# Altium footprint library PcbLib.PcbLib: 68 footprints (part 3 of 5)
Each footprint in its own frame and in the unit in brackets; x right, y up, seen from the top. Pads: shape width x height; smd on the part's side, far side on the other; paste and mask are expansions set on the pad; w line width, h text height; cw(c..) or ccw(c..) is an arc to the next point about the centre after c.
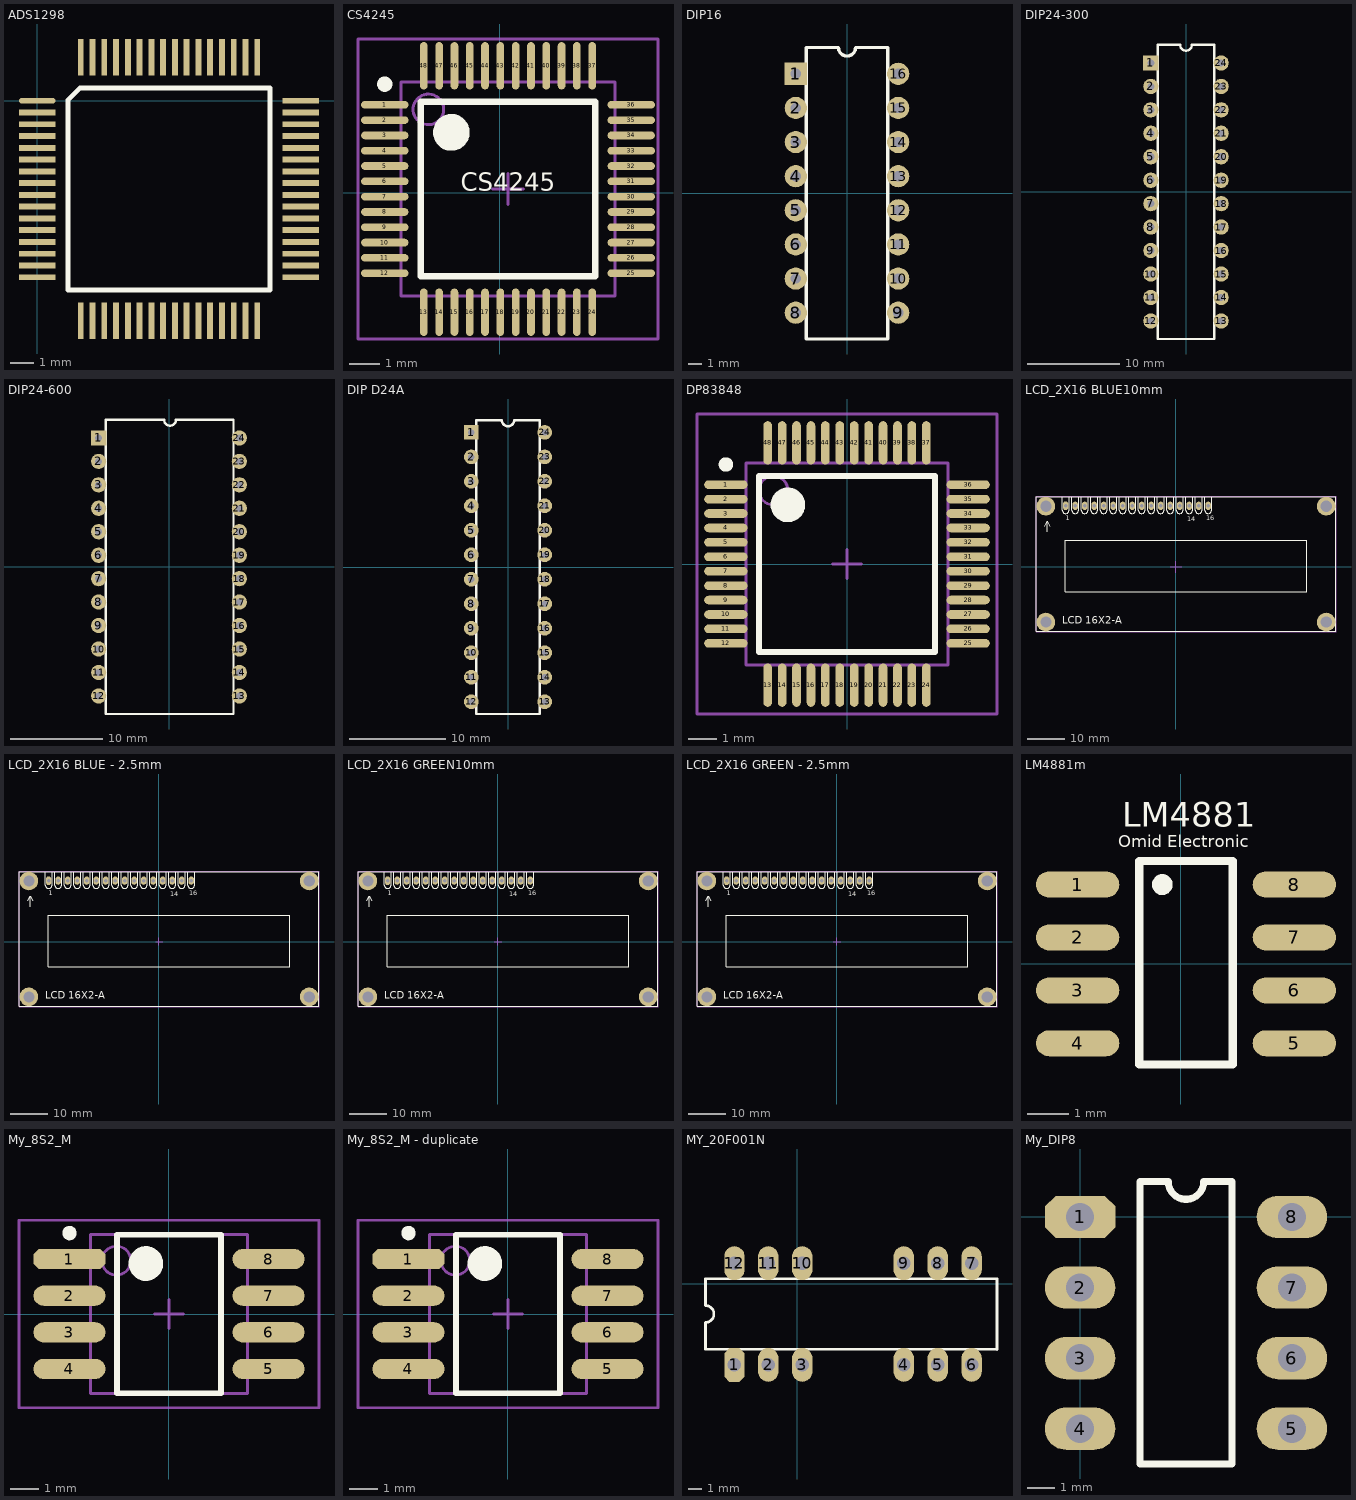
[diagram p2: the footprints below, top view; thin cyan lines are the x and y axes]

## ADS1298 [mm]
pads (64):
  oval 1.55x0.25 smd: 1(0,0)
  rect 1.55x0.25 smd: 2(0,-0.5) 3(0,-1) 4(0,-1.5) 5(0,-2) 6(0,-2.5) 7(0,-3) 8(0,-3.5) 9(0,-4) 10(0,-4.5) 11(0,-5) 12(0,-5.5) 13(0,-6) 14(0,-6.5) 15(0,-7) 16(0,-7.5) 33(11.2,-7.5) 34(11.2,-7) 35(11.2,-6.5) 36(11.2,-6) 37(11.2,-5.5) 38(11.2,-5) 39(11.2,-4.5) 40(11.2,-4) 41(11.2,-3.5) 42(11.2,-3) 43(11.2,-2.5) 44(11.2,-2) 45(11.2,-1.5) 46(11.2,-1) 47(11.2,-0.5) 48(11.2,0)
  rect 0.25x1.55 smd: 17(1.85,-9.35) 18(2.35,-9.35) 19(2.85,-9.35) 20(3.35,-9.35) 21(3.85,-9.35) 22(4.35,-9.35) 23(4.85,-9.35) 24(5.35,-9.35) 25(5.85,-9.35) 26(6.35,-9.35) 27(6.85,-9.35) 28(7.35,-9.35) 29(7.85,-9.35) 30(8.35,-9.35) 31(8.85,-9.35) 32(9.35,-9.35) 49(9.35,1.85) 50(8.85,1.85) 51(8.35,1.85) 52(7.85,1.85) 53(7.35,1.85) 54(6.85,1.85) 55(6.35,1.85) 56(5.85,1.85) 57(5.35,1.85) 58(4.85,1.85) 59(4.35,1.85) 60(3.85,1.85) 61(3.35,1.85) 62(2.85,1.85) 63(2.35,1.85) 64(1.85,1.85)
Top Overlay:
  lines w0.2: 1.31,-8.04 1.31,0.04 1.81,0.54 9.89,0.54 9.89,-8.04 1.31,-8.04

## CS4245 [mm]
pads (48):
  oval 1.55x0.25 smd: 1(-3.75,2.875) 2(-3.75,2.375) 3(-3.75,1.875) 4(-3.75,1.375) 5(-3.75,0.875) 6(-3.75,0.375) 7(-3.75,-0.125) 8(-3.75,-0.625) 9(-3.75,-1.125) 10(-3.75,-1.625) 11(-3.75,-2.125) 12(-3.75,-2.625) 25(4.3,-2.625) 26(4.3,-2.125) 27(4.3,-1.625) 28(4.3,-1.125) 29(4.3,-0.625) 30(4.3,-0.125) 31(4.3,0.375) 32(4.3,0.875) 33(4.3,1.375) 34(4.3,1.875) 35(4.3,2.375) 36(4.3,2.875)
  oval 0.25x1.55 smd: 13(-2.475,-3.9) 14(-1.975,-3.9) 15(-1.475,-3.9) 16(-0.975,-3.9) 17(-0.475,-3.9) 18(0.025,-3.9) 19(0.525,-3.9) 20(1.025,-3.9) 21(1.525,-3.9) 22(2.025,-3.9) 23(2.525,-3.9) 24(3.025,-3.9) 37(3.025,4.15) 38(2.525,4.15) 39(2.025,4.15) 40(1.525,4.15) 41(1.025,4.15) 42(0.525,4.15) 43(0.025,4.15) 44(-0.475,4.15) 45(-0.975,4.15) 46(-1.475,4.15) 47(-1.975,4.15) 48(-2.475,4.15)
Top Overlay:
  circle w0.25: c-3.75,3.55 r0.125
  circle w0.6: c-1.575,1.975 r0.3
  lines w0.2: -2.575,-2.725 -2.575,2.975 3.125,2.975 3.125,-2.725 -2.575,-2.725
  text "CS4245" at -1.27,-0.127 h1
Mechanical 13:
  circle w0.1: c-2.325,2.725 r0.5
  lines w0.1: -3.225,-3.375 -3.225,3.625 3.775,3.625 3.775,-3.375 -3.225,-3.375
Mechanical 15:
  lines w0.1: -0.225,0.125 0.775,0.125 ; 0.275,-0.375 0.275,0.625 ; -4.625,-4.775 -4.625,5.025 5.175,5.025 5.175,-4.775 -4.625,-4.775
3D body: height 1.6, standoff 0, extent -3.225,-3.375 3.775,3.625

## DIP16 [mil]
pads (16):
  rect 65x65 hole 30: 1(-150,350)
  round 65 hole 30: 2(-150,250) 3(-150,150) 4(-150,50) 5(-150,-50) 6(-150,-150) 7(-150,-250) 8(-150,-350) 9(150,-350) 10(150,-250) 11(150,-150) 12(150,-50) 13(150,50) 14(150,150) 15(150,250) 16(150,350)
Top Overlay:
  lines w10: -120,-427 -120,427 -25,427 ccw(c0,427) 25,427 120,427 120,-427 -120,-427
3D body "SW3dPS-DIP16-300.step": height 200, standoff -98.03, extent -154.92,-393.7 154.92,393.7

## DIP24-300 [mil]
pads (24):
  rect 65x65 hole 30: 1(-150,550)
  round 65 hole 30: 2(-150,450) 3(-150,350) 4(-150,250) 5(-150,150) 6(-150,50) 7(-150,-50) 8(-150,-150) 9(-150,-250) 10(-150,-350) 11(-150,-450) 12(-150,-550) 13(150,-550) 14(150,-450) 15(150,-350) 16(150,-250) 17(150,-150) 18(150,-50) 19(150,50) 20(150,150) 21(150,250) 22(150,350) 23(150,450) 24(150,550)
Top Overlay:
  lines w10: -120,-627 -120,627 -25,627 ccw(c0,627) 25,627 120,627 120,-627 -120,-627
3D body "SW3dPS-DIP24-300.step": height 200, standoff -98.03, extent -154.92,-635.04 154.92,635.04

## DIP24-600 [mil]
pads (24):
  rect 65x65 hole 30: 1(-300,550)
  round 65 hole 30: 2(-300,450) 3(-300,350) 4(-300,250) 5(-300,150) 6(-300,50) 7(-300,-50) 8(-300,-150) 9(-300,-250) 10(-300,-350) 11(-300,-450) 12(-300,-550) 13(300,-550) 14(300,-450) 15(300,-350) 16(300,-250) 17(300,-150) 18(300,-50) 19(300,50) 20(300,150) 21(300,250) 22(300,350) 23(300,450) 24(300,550)
Top Overlay:
  lines w10: -21.47,627 -270,627 -270,-627 275,-627 275,627 29.47,627 cw(c4.47,626.98) -20.53,626.98
3D body "SW3dPS-DIP24-600.step": height 224.41, standoff -101.57, extent -304.92,-635.04 304.92,635.04

## DIP D24A [mil]
pads (24):
  rect 60x60 hole 25: 1(-150,550)
  round 60 hole 25: 2(-150,450) 3(-150,350) 4(-150,250) 5(-150,150) 6(-150,50) 7(-150,-50) 8(-150,-150) 9(-150,-250) 10(-150,-350) 11(-150,-450) 12(-150,-550) 13(150,-550) 14(150,-450) 15(150,-350) 16(150,-250) 17(150,-150) 18(150,-50) 19(150,50) 20(150,150) 21(150,250) 22(150,350) 23(150,450) 24(150,550)
Top Overlay:
  lines w10: -130,-600 130,-600 130,600 25,600 cw(c0,600) -25,600 -130,600 -130,-600
Mechanical 1:
  drawing of 288 lines, arcs and shapes, not listed
3D body: height 75, standoff 65, extent -145,525 -135,575
3D body: height 0, standoff 0, extent -155,525 -155,575
3D body: height 75, standoff 35, extent -155,525 -145,575
3D body: height 35, standoff -75, extent -155,541 -145,559
3D body: height 100, standoff 30, extent -135,-605 135,605
3D body: height 115, standoff 100, extent -135,-605 135,605
3D body: height 35, standoff -75, extent -155,441 -145,459
3D body: height 75, standoff 35, extent -155,425 -145,475
3D body: height 75, standoff 65, extent -145,425 -135,475
3D body: height 35, standoff -75, extent -155,341 -145,359
3D body: height 75, standoff 35, extent -155,325 -145,375
3D body: height 75, standoff 65, extent -145,325 -135,375
3D body: height 35, standoff -75, extent -155,241 -145,259
3D body: height 75, standoff 35, extent -155,225 -145,275
3D body: height 75, standoff 65, extent -145,225 -135,275
3D body: height 35, standoff -75, extent -155,141 -145,159
3D body: height 75, standoff 35, extent -155,125 -145,175
3D body: height 75, standoff 65, extent -145,125 -135,175
3D body: height 35, standoff -75, extent -155,41 -145,59
3D body: height 75, standoff 35, extent -155,25 -145,75
3D body: height 75, standoff 65, extent -145,25 -135,75
3D body: height 35, standoff -75, extent -155,-59 -145,-41
3D body: height 75, standoff 35, extent -155,-75 -145,-25
3D body: height 75, standoff 65, extent -145,-75 -135,-25
3D body: height 35, standoff -75, extent -155,-159 -145,-141
3D body: height 75, standoff 35, extent -155,-175 -145,-125
3D body: height 75, standoff 65, extent -145,-175 -135,-125
3D body: height 35, standoff -75, extent -155,-259 -145,-241
3D body: height 75, standoff 35, extent -155,-275 -145,-225
3D body: height 75, standoff 65, extent -145,-275 -135,-225
3D body: height 35, standoff -75, extent -155,-359 -145,-341
3D body: height 75, standoff 35, extent -155,-375 -145,-325
3D body: height 75, standoff 65, extent -145,-375 -135,-325
3D body: height 35, standoff -75, extent -155,-459 -145,-441
3D body: height 75, standoff 35, extent -155,-475 -145,-425
3D body: height 75, standoff 65, extent -145,-475 -135,-425
3D body: height 35, standoff -75, extent -155,-559 -145,-541
3D body: height 75, standoff 35, extent -155,-575 -145,-525
3D body: height 75, standoff 65, extent -145,-575 -135,-525
3D body: height 35, standoff -75, extent 145,-559 155,-541
3D body: height 75, standoff 35, extent 145,-575 155,-525
3D body: height 75, standoff 65, extent 135,-575 145,-525
3D body: height 35, standoff -75, extent 145,-459 155,-441
3D body: height 75, standoff 35, extent 145,-475 155,-425
3D body: height 75, standoff 65, extent 135,-475 145,-425
3D body: height 35, standoff -75, extent 145,-359 155,-341
3D body: height 75, standoff 35, extent 145,-375 155,-325
3D body: height 75, standoff 65, extent 135,-375 145,-325
3D body: height 35, standoff -75, extent 145,-259 155,-241
3D body: height 75, standoff 35, extent 145,-275 155,-225
3D body: height 75, standoff 65, extent 135,-275 145,-225
3D body: height 35, standoff -75, extent 145,-159 155,-141
3D body: height 75, standoff 35, extent 145,-175 155,-125
3D body: height 75, standoff 65, extent 135,-175 145,-125
3D body: height 35, standoff -75, extent 145,-59 155,-41
3D body: height 75, standoff 35, extent 145,-75 155,-25
3D body: height 75, standoff 65, extent 135,-75 145,-25
3D body: height 35, standoff -75, extent 145,41 155,59
3D body: height 75, standoff 35, extent 145,25 155,75
3D body: height 75, standoff 65, extent 135,25 145,75
3D body: height 35, standoff -75, extent 145,141 155,159
3D body: height 75, standoff 35, extent 145,125 155,175
3D body: height 75, standoff 65, extent 135,125 145,175
3D body: height 35, standoff -75, extent 145,241 155,259
3D body: height 75, standoff 35, extent 145,225 155,275
3D body: height 75, standoff 65, extent 135,225 145,275
3D body: height 35, standoff -75, extent 145,341 155,359
3D body: height 75, standoff 35, extent 145,325 155,375
3D body: height 75, standoff 65, extent 135,325 145,375
3D body: height 35, standoff -75, extent 145,441 155,459
3D body: height 75, standoff 35, extent 145,425 155,475
3D body: height 75, standoff 65, extent 135,425 145,475
3D body: height 35, standoff -75, extent 145,541 155,559
3D body: height 75, standoff 35, extent 145,525 155,575
3D body: height 75, standoff 65, extent 135,525 145,575

## DP83848 [mm] "network phy"
height 1.405
pads (48):
  oval 1.5x0.3 smd: 1(-4.2,2.75) 2(-4.2,2.25) 3(-4.2,1.75) 4(-4.2,1.25) 5(-4.2,0.75) 6(-4.2,0.25) 7(-4.2,-0.25) 8(-4.2,-0.75) 9(-4.2,-1.25) 10(-4.2,-1.75) 11(-4.2,-2.25) 12(-4.2,-2.75) 25(4.2,-2.75) 26(4.2,-2.25) 27(4.2,-1.75) 28(4.2,-1.25) 29(4.2,-0.75) 30(4.2,-0.25) 31(4.2,0.25) 32(4.2,0.75) 33(4.2,1.25) 34(4.2,1.75) 35(4.2,2.25) 36(4.2,2.75)
  oval 0.3x1.5 smd: 13(-2.75,-4.2) 14(-2.25,-4.2) 15(-1.75,-4.2) 16(-1.25,-4.2) 17(-0.75,-4.2) 18(-0.25,-4.2) 19(0.25,-4.2) 20(0.75,-4.2) 21(1.25,-4.2) 22(1.75,-4.2) 23(2.25,-4.2) 24(2.75,-4.2) 37(2.75,4.2) 38(2.25,4.2) 39(1.75,4.2) 40(1.25,4.2) 41(0.75,4.2) 42(0.25,4.2) 43(-0.25,4.2) 44(-0.75,4.2) 45(-1.25,4.2) 46(-1.75,4.2) 47(-2.25,4.2) 48(-2.75,4.2)
Top Overlay:
  circle w0.6: c-2.05,2.05 r0.3
  circle w0.25: c-4.2,3.45 r0.125
  lines w0.2: -3.05,-3.05 3.05,-3.05 3.05,3.05 -3.05,3.05 -3.05,-3.05
Mechanical 13:
  circle w0.1: c-2.55,2.55 r0.5
  lines w0.1: -3.5,-3.5 3.5,-3.5 3.5,3.5 -3.5,3.5 -3.5,-3.5
Mechanical 15:
  lines w0.1: -0.5,0 0.5,0 ; 0,-0.5 0,0.5 ; -5.2,-5.2 5.2,-5.2 5.2,5.2 -5.2,5.2 -5.2,-5.2
3D body: height 1.41, standoff 0.5, extent -3.5,-3.5 3.5,3.5

## LCD_2X16 BLUE10mm [mm] "LCD 2x16 Alphanumberic-Designer Abbas Basereh"
height 50
pads (20):
  oct 1.5x2.2 hole 1: 1(-29.464,16.3)
  oval 1.5x2.2 hole 1: 2(-26.924,16.3) 3(-24.384,16.3) 4(-21.844,16.3) 5(-19.304,16.3) 6(-16.764,16.3) 7(-14.224,16.3) 8(-11.684,16.3) 9(-9.144,16.3) 10(-6.604,16.3) 11(-4.064,16.3) 12(-1.524,16.3) 13(1.016,16.3) 14(3.556,16.3) 15(6.096,16.3) 16(8.636,16.3)
  round 5 hole 3: ""(-34.756,-14.775) ""(-34.756,16.213) ""(40.174,-14.775) ""(40.174,16.213)
Top Overlay:
  circle w0.2: c-34.796,-14.788 r1.25
  circle w0.2: c40.204,-14.788 r1.25
  circle w0.2: c-34.796,16.213 r1.25
  circle w0.2: c40.204,16.213 r1.25
  lines w0.2: -35.01,10.879 -34.375,12.149 -33.74,10.879 ; -34.375,9.337 -34.375,12.022 ; -30.353,18.669 -30.353,15.113 ccw(c-29.464,15.113) -28.575,15.113 -28.575,18.669 ; -27.813,18.669 -27.813,15.113 ccw(c-26.924,15.113) -26.035,15.113 -26.035,18.669 ; -25.273,18.669 -25.273,15.113 ccw(c-24.384,15.113) -23.495,15.113 -23.495,18.669 ; -22.733,18.669 -22.733,15.113 ccw(c-21.844,15.113) -20.955,15.113 -20.955,18.669 ; -20.193,18.669 -20.193,15.113 ccw(c-19.304,15.113) -18.415,15.113 -18.415,18.669 ; -17.653,18.669 -17.653,15.113 ccw(c-16.764,15.113) -15.875,15.113 -15.875,18.669 ; -15.113,18.669 -15.113,15.113 ccw(c-14.224,15.113) -13.335,15.113 -13.335,18.669 ; -12.573,18.669 -12.573,15.113 ccw(c-11.684,15.113) -10.795,15.113 -10.795,18.669 ; -10.033,18.669 -10.033,15.113 ccw(c-9.144,15.113) -8.255,15.113 -8.255,18.669 ; -7.493,18.669 -7.493,15.113 ccw(c-6.604,15.113) -5.715,15.113 -5.715,18.669 ; -4.953,18.669 -4.953,15.113 ccw(c-4.064,15.113) -3.175,15.113 -3.175,18.669 ; -2.413,18.669 -2.413,15.113 ccw(c-1.524,15.113) -0.635,15.113 -0.635,18.669 ; 0.127,18.669 0.127,15.113 ccw(c1.016,15.113) 1.905,15.113 1.905,18.669 ; 2.667,18.669 2.667,15.113 ccw(c3.556,15.113) 4.445,15.113 4.445,18.669 ; 5.207,18.669 5.207,15.113 ccw(c6.096,15.113) 6.985,15.113 6.985,18.669 ; 7.747,18.669 7.747,15.113 ccw(c8.636,15.113) 9.525,15.113 9.525,18.669 ; -37.296,-17.288 42.704,-17.288 42.704,18.712 -37.296,18.712 -37.296,-17.288 ; -29.546,-6.688 -29.546,7.112 34.954,7.112 34.954,-6.688 -29.546,-6.688
  text "14" at 3.048,12.192 h1.27
  text "1" at -29.464,12.446 h1.27
  text "16" at 8.128,12.446 h1.27
  text "LCD 16X2-A" at -30.438,-15.283 h1.91
Mechanical 15:
  lines w0.15: -1.5,0 1.5,0 ; -0.1,-1.6 -0.1,1.5 ; -37.4,-17.4 -37.4,18.9 42.8,18.9 42.8,-17.4 -37.4,-17.4
3D body: height 10, standoff 0, extent -30.25,15.25 9.75,17.75
3D body "User Library-LCD-5.STEP": height 19.8, standoff 1.5, extent -37.35,-17.3 42.65,18.7
3D body: height 10, standoff 0, extent -37.338,13.589 -32.131,18.796
3D body: height 10, standoff 0, extent -37.338,-17.399 -32.131,-12.192
3D body: height 10, standoff 0, extent 37.592,-17.399 42.799,-12.192
3D body: height 10, standoff 0, extent 37.592,13.589 42.799,18.796

## LCD_2X16 BLUE - 2.5mm [mm] "LCD 2x16 Alphanumberic-Designer Abbas Basereh"
height 40
pads (20):
  oct 1.5x2.2 hole 1: 1(-29.464,16.3)
  oval 1.5x2.2 hole 1: 2(-26.924,16.3) 3(-24.384,16.3) 4(-21.844,16.3) 5(-19.304,16.3) 6(-16.764,16.3) 7(-14.224,16.3) 8(-11.684,16.3) 9(-9.144,16.3) 10(-6.604,16.3) 11(-4.064,16.3) 12(-1.524,16.3) 13(1.016,16.3) 14(3.556,16.3) 15(6.096,16.3) 16(8.636,16.3)
  round 5 hole 3: ""(-34.756,-14.775) ""(-34.756,16.213) ""(40.174,-14.775) ""(40.174,16.213)
Top Overlay:
  circle w0.2: c40.204,16.213 r1.25
  circle w0.2: c-34.796,16.213 r1.25
  circle w0.2: c40.204,-14.788 r1.25
  circle w0.2: c-34.796,-14.788 r1.25
  lines w0.2: -35.01,10.879 -34.375,12.149 -33.74,10.879 ; -34.375,9.337 -34.375,12.022 ; -30.353,18.669 -30.353,15.113 ccw(c-29.464,15.113) -28.575,15.113 -28.575,18.669 ; -27.813,18.669 -27.813,15.113 ccw(c-26.924,15.113) -26.035,15.113 -26.035,18.669 ; -25.273,18.669 -25.273,15.113 ccw(c-24.384,15.113) -23.495,15.113 -23.495,18.669 ; -22.733,18.669 -22.733,15.113 ccw(c-21.844,15.113) -20.955,15.113 -20.955,18.669 ; -20.193,18.669 -20.193,15.113 ccw(c-19.304,15.113) -18.415,15.113 -18.415,18.669 ; -17.653,18.669 -17.653,15.113 ccw(c-16.764,15.113) -15.875,15.113 -15.875,18.669 ; -15.113,18.669 -15.113,15.113 ccw(c-14.224,15.113) -13.335,15.113 -13.335,18.669 ; -12.573,18.669 -12.573,15.113 ccw(c-11.684,15.113) -10.795,15.113 -10.795,18.669 ; -10.033,18.669 -10.033,15.113 ccw(c-9.144,15.113) -8.255,15.113 -8.255,18.669 ; -7.493,18.669 -7.493,15.113 ccw(c-6.604,15.113) -5.715,15.113 -5.715,18.669 ; -4.953,18.669 -4.953,15.113 ccw(c-4.064,15.113) -3.175,15.113 -3.175,18.669 ; -2.413,18.669 -2.413,15.113 ccw(c-1.524,15.113) -0.635,15.113 -0.635,18.669 ; 0.127,18.669 0.127,15.113 ccw(c1.016,15.113) 1.905,15.113 1.905,18.669 ; 2.667,18.669 2.667,15.113 ccw(c3.556,15.113) 4.445,15.113 4.445,18.669 ; 5.207,18.669 5.207,15.113 ccw(c6.096,15.113) 6.985,15.113 6.985,18.669 ; 7.747,18.669 7.747,15.113 ccw(c8.636,15.113) 9.525,15.113 9.525,18.669 ; -37.296,-17.288 -37.296,18.712 42.704,18.712 42.704,-17.288 -37.296,-17.288 ; -29.546,-6.688 34.954,-6.688 34.954,7.112 -29.546,7.112 -29.546,-6.688
  text "LCD 16X2-A" at -30.438,-15.283 h1.91
  text "16" at 8.128,12.446 h1.27
  text "1" at -29.464,12.446 h1.27
  text "14" at 3.048,12.192 h1.27
Mechanical 15:
  lines w0.15: -0.9,0 1,0 ; 0,-1 0,1 ; -37.4,-17.4 -37.4,18.8 42.8,18.8 42.8,-17.4 -37.4,-17.4
3D body "User Library-LCD-5.STEP": height 12.3, standoff -6, extent -37.35,-17.3 42.65,18.7

## LCD_2X16 GREEN10mm [mm] "LCD 2x16 Alphanumberic-Designer Abbas Basereh"
height 50
pads (20):
  oct 1.5x2.2 hole 1: 1(-29.464,16.3)
  oval 1.5x2.2 hole 1: 2(-26.924,16.3) 3(-24.384,16.3) 4(-21.844,16.3) 5(-19.304,16.3) 6(-16.764,16.3) 7(-14.224,16.3) 8(-11.684,16.3) 9(-9.144,16.3) 10(-6.604,16.3) 11(-4.064,16.3) 12(-1.524,16.3) 13(1.016,16.3) 14(3.556,16.3) 15(6.096,16.3) 16(8.636,16.3)
  round 5 hole 3: ""(-34.756,-14.775) ""(-34.756,16.213) ""(40.174,-14.775) ""(40.174,16.213)
Top Overlay:
  circle w0.2: c-34.796,-14.788 r1.25
  circle w0.2: c40.204,-14.788 r1.25
  circle w0.2: c-34.796,16.213 r1.25
  circle w0.2: c40.204,16.213 r1.25
  lines w0.2: -35.01,10.879 -34.375,12.149 -33.74,10.879 ; -34.375,9.337 -34.375,12.022 ; -30.353,18.669 -30.353,15.113 ccw(c-29.464,15.113) -28.575,15.113 -28.575,18.669 ; -27.813,18.669 -27.813,15.113 ccw(c-26.924,15.113) -26.035,15.113 -26.035,18.669 ; -25.273,18.669 -25.273,15.113 ccw(c-24.384,15.113) -23.495,15.113 -23.495,18.669 ; -22.733,18.669 -22.733,15.113 ccw(c-21.844,15.113) -20.955,15.113 -20.955,18.669 ; -20.193,18.669 -20.193,15.113 ccw(c-19.304,15.113) -18.415,15.113 -18.415,18.669 ; -17.653,18.669 -17.653,15.113 ccw(c-16.764,15.113) -15.875,15.113 -15.875,18.669 ; -15.113,18.669 -15.113,15.113 ccw(c-14.224,15.113) -13.335,15.113 -13.335,18.669 ; -12.573,18.669 -12.573,15.113 ccw(c-11.684,15.113) -10.795,15.113 -10.795,18.669 ; -10.033,18.669 -10.033,15.113 ccw(c-9.144,15.113) -8.255,15.113 -8.255,18.669 ; -7.493,18.669 -7.493,15.113 ccw(c-6.604,15.113) -5.715,15.113 -5.715,18.669 ; -4.953,18.669 -4.953,15.113 ccw(c-4.064,15.113) -3.175,15.113 -3.175,18.669 ; -2.413,18.669 -2.413,15.113 ccw(c-1.524,15.113) -0.635,15.113 -0.635,18.669 ; 0.127,18.669 0.127,15.113 ccw(c1.016,15.113) 1.905,15.113 1.905,18.669 ; 2.667,18.669 2.667,15.113 ccw(c3.556,15.113) 4.445,15.113 4.445,18.669 ; 5.207,18.669 5.207,15.113 ccw(c6.096,15.113) 6.985,15.113 6.985,18.669 ; 7.747,18.669 7.747,15.113 ccw(c8.636,15.113) 9.525,15.113 9.525,18.669 ; -37.296,-17.288 42.704,-17.288 42.704,18.712 -37.296,18.712 -37.296,-17.288 ; -29.546,-6.688 -29.546,7.112 34.954,7.112 34.954,-6.688 -29.546,-6.688
  text "14" at 3.048,12.192 h1.27
  text "1" at -29.464,12.446 h1.27
  text "16" at 8.128,12.446 h1.27
  text "LCD 16X2-A" at -30.438,-15.283 h1.91
Mechanical 15:
  lines w0.15: -1,0 1,0 ; 0,-1 0,1 ; -37.4,-17.4 -37.4,18.8 42.8,18.8 42.8,-17.4 -37.3,-17.4 -37.4,-17.4
3D body: height 10, standoff 0, extent -30.25,15.25 9.75,17.75
3D body "User Library-LCD 16x2 JHD162A.STEP": height 20.6, standoff 7.45, extent -37.35,-17.3 42.65,18.7
3D body: height 10, standoff 0, extent -37.338,13.589 -32.131,18.796
3D body: height 10, standoff 0, extent -37.338,-17.399 -32.131,-12.192
3D body: height 10, standoff 0, extent 37.592,-17.399 42.799,-12.192
3D body: height 10, standoff 0, extent 37.592,13.589 42.799,18.796

## LCD_2X16 GREEN - 2.5mm [mm] "LCD 2x16 Alphanumberic-Designer Abbas Basereh"
height 40
pads (20):
  oct 1.5x2.2 hole 1: 1(-29.464,16.3)
  oval 1.5x2.2 hole 1: 2(-26.924,16.3) 3(-24.384,16.3) 4(-21.844,16.3) 5(-19.304,16.3) 6(-16.764,16.3) 7(-14.224,16.3) 8(-11.684,16.3) 9(-9.144,16.3) 10(-6.604,16.3) 11(-4.064,16.3) 12(-1.524,16.3) 13(1.016,16.3) 14(3.556,16.3) 15(6.096,16.3) 16(8.636,16.3)
  round 5 hole 3: ""(-34.756,-14.775) ""(-34.756,16.213) ""(40.174,-14.775) ""(40.174,16.213)
Top Overlay:
  circle w0.2: c40.204,16.213 r1.25
  circle w0.2: c-34.796,16.213 r1.25
  circle w0.2: c40.204,-14.788 r1.25
  circle w0.2: c-34.796,-14.788 r1.25
  lines w0.2: -35.01,10.879 -34.375,12.149 -33.74,10.879 ; -34.375,9.337 -34.375,12.022 ; -30.353,18.669 -30.353,15.113 ccw(c-29.464,15.113) -28.575,15.113 -28.575,18.669 ; -27.813,18.669 -27.813,15.113 ccw(c-26.924,15.113) -26.035,15.113 -26.035,18.669 ; -25.273,18.669 -25.273,15.113 ccw(c-24.384,15.113) -23.495,15.113 -23.495,18.669 ; -22.733,18.669 -22.733,15.113 ccw(c-21.844,15.113) -20.955,15.113 -20.955,18.669 ; -20.193,18.669 -20.193,15.113 ccw(c-19.304,15.113) -18.415,15.113 -18.415,18.669 ; -17.653,18.669 -17.653,15.113 ccw(c-16.764,15.113) -15.875,15.113 -15.875,18.669 ; -15.113,18.669 -15.113,15.113 ccw(c-14.224,15.113) -13.335,15.113 -13.335,18.669 ; -12.573,18.669 -12.573,15.113 ccw(c-11.684,15.113) -10.795,15.113 -10.795,18.669 ; -10.033,18.669 -10.033,15.113 ccw(c-9.144,15.113) -8.255,15.113 -8.255,18.669 ; -7.493,18.669 -7.493,15.113 ccw(c-6.604,15.113) -5.715,15.113 -5.715,18.669 ; -4.953,18.669 -4.953,15.113 ccw(c-4.064,15.113) -3.175,15.113 -3.175,18.669 ; -2.413,18.669 -2.413,15.113 ccw(c-1.524,15.113) -0.635,15.113 -0.635,18.669 ; 0.127,18.669 0.127,15.113 ccw(c1.016,15.113) 1.905,15.113 1.905,18.669 ; 2.667,18.669 2.667,15.113 ccw(c3.556,15.113) 4.445,15.113 4.445,18.669 ; 5.207,18.669 5.207,15.113 ccw(c6.096,15.113) 6.985,15.113 6.985,18.669 ; 7.747,18.669 7.747,15.113 ccw(c8.636,15.113) 9.525,15.113 9.525,18.669 ; -37.296,-17.288 -37.296,18.712 42.704,18.712 42.704,-17.288 -37.296,-17.288 ; -29.546,-6.688 34.954,-6.688 34.954,7.112 -29.546,7.112 -29.546,-6.688
  text "LCD 16X2-A" at -30.438,-15.283 h1.91
  text "16" at 8.128,12.446 h1.27
  text "1" at -29.464,12.446 h1.27
  text "14" at 3.048,12.192 h1.27
Mechanical 15:
  lines w0.15: -1,0 1,0 ; 0,-1 0,1 ; -37.4,-17.4 42.8,-17.4 42.8,18.8 -37.4,18.8 -37.4,-17.4
3D body "User Library-LCD 16x2 JHD162A.STEP": height 13.1, standoff -0.05, extent -37.35,-17.3 42.65,18.7

## LM4881m [mm]
pads (8):
  oval 2x0.625 smd: 1(-2.475,1.905) 2(-2.475,0.635) 3(-2.475,-0.635) 4(-2.475,-1.905) 5(2.725,-1.905) 6(2.725,-0.635) 7(2.725,0.635) 8(2.725,1.905)
Top Overlay:
  circle w0.25: c-0.443,1.903 r0.125
  lines w0.2: -1,-2.413 -1,2.47 1.25,2.47 1.25,-2.413 -1,-2.413
  text "LM4881" at -1.4,3.1 h1
  text "Omid Electronic" at -1.5,2.7 h0.5
3D body "SO8_narrow.step": height 1.7, standoff 0, extent -2.974,-2.413 3.224,2.413

## My_8S2_M [mm]
pads (8):
  oct 2.5x0.7 smd: 1(-3.45,1.905)
  oval 2.5x0.7 smd: 2(-3.45,0.635) 3(-3.45,-0.635) 4(-3.45,-1.905) 5(3.45,-1.905) 6(3.45,-0.635) 7(3.45,0.635) 8(3.45,1.905)
Top Overlay:
  circle w0.25: c-3.45,2.805 r0.125
  circle w0.6: c-0.8,1.75 r0.3
  lines w0.2: -1.8,-2.75 -1.8,2.75 1.8,2.75 1.8,-2.75 -1.8,-2.75
Mechanical 13:
  circle w0.1: c-1.825,1.85 r0.5
  lines w0.1: -2.725,-2.75 -2.725,2.75 2.725,2.75 2.725,-2.75 -2.725,-2.75
Mechanical 15:
  lines w0.1: -0.5,0 0.5,0 ; 0,-0.5 0,0.5 ; -5.2,-3.25 -5.2,3.25 5.2,3.25 5.2,-3.25 -5.2,-3.25
3D body: height 2.03, standoff 0, extent -2.725,-2.75 2.725,2.75

## My_8S2_M - duplicate [mm]
pads (8):
  oct 2.5x0.7 smd: 1(-3.45,1.905)
  oval 2.5x0.7 smd: 2(-3.45,0.635) 3(-3.45,-0.635) 4(-3.45,-1.905) 5(3.45,-1.905) 6(3.45,-0.635) 7(3.45,0.635) 8(3.45,1.905)
Top Overlay:
  circle w0.25: c-3.45,2.805 r0.125
  circle w0.6: c-0.8,1.75 r0.3
  lines w0.2: -1.8,-2.75 -1.8,2.75 1.8,2.75 1.8,-2.75 -1.8,-2.75
Mechanical 13:
  circle w0.1: c-1.825,1.85 r0.5
  lines w0.1: -2.725,-2.75 -2.725,2.75 2.725,2.75 2.725,-2.75 -2.725,-2.75
Mechanical 15:
  lines w0.1: -0.5,0 0.5,0 ; 0,-0.5 0,0.5 ; -5.2,-3.25 -5.2,3.25 5.2,3.25 5.2,-3.25 -5.2,-3.25
3D body: height 2.03, standoff 0, extent -2.725,-2.75 2.725,2.75

## MY_20F001N [mil]
height 236.22
pads (12):
  oct 60x100 hole 40: 1(-185,-240)
  oval 60x100 hole 40: 2(-85,-240) 3(15,-240) 4(315,-240) 5(415,-240) 6(515,-240) 7(515,60) 8(415,60) 9(315,60) 10(15,60) 11(-85,60) 12(-185,60)
Top Overlay:
  lines w7.87: 590,-194.33 -270.43,-194.33 -270.43,-115 ccw(c-270.43,-90) -270.43,-65 -270.43,14.33 590,14.33
  lines w10: 590,-194.33 590,9.33

## My_DIP8 [mil]
pads (8):
  oct 100x60 hole 40: 1(0,0)
  oval 100x60 hole 40: 2(0,-100) 3(0,-200) 4(0,-300) 5(300,-300) 6(300,-200) 7(300,-100) 8(300,0)
Top Overlay:
  lines w10: 85,-350 215,-350 215,50 175,50 cw(c150,50) 125,50 85,50 85,-350